# Altium schematic symbol library jlcpcb_2025_04_capacitors_extended_0402.schlib: 3594 symbols (part 10 of 20)
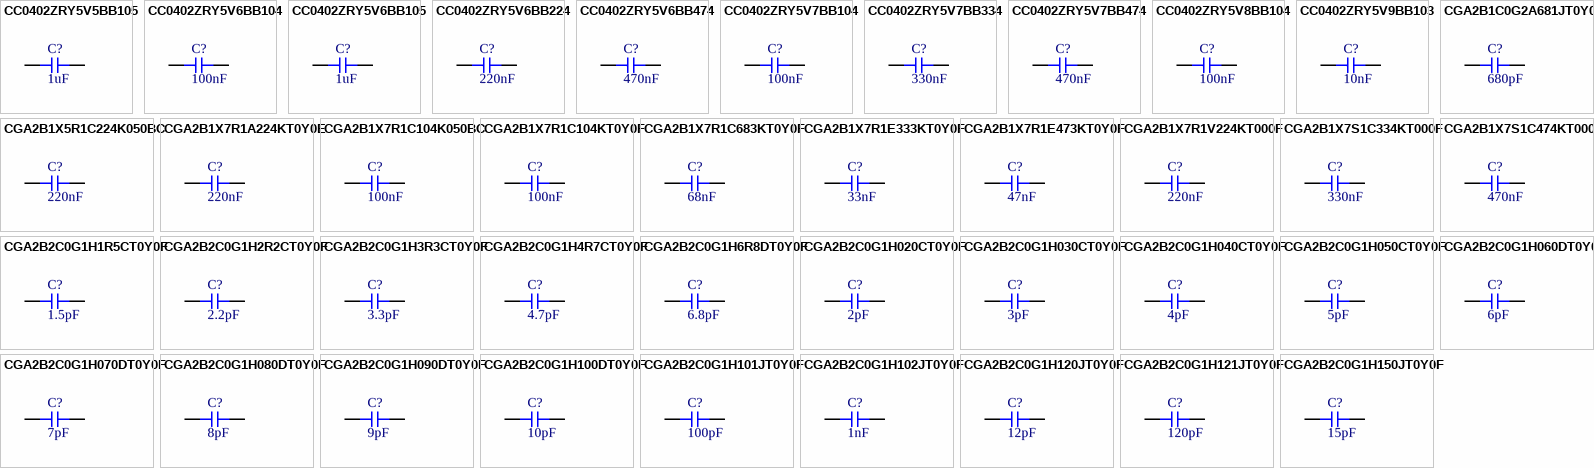
[diagram p98: symbols CC0402ZRY5V5BB105 to CGA2B2C0G1H150JT0Y0F]

## CC0402ZRY5V5BB105
designator C?  Capacitance: 1uF  (hidden comment: *)
Capacitor, Ceramic (MLCC), 1uF, 6.3V, Y5V, SMD 0402; Manufacturer: YAGEO; Manufacturer Part Number: CC0402ZRY5V5BB105; Temperature Rating: -20%~+80%; Package Size: 0402; JLCPCB Basic Part: No; JLCPCB Part Number: C527032; Supplier 1: LCSC; Category: Capacitors - MLCC; Supplier Part Number 1: C527032; Voltage Rating: 6.3V; Temperature Coefficient: Y5V; RoHS: Yes; ComponentLink1Description: Datasheet; ComponentLink1URL: https://wmsc.lcsc.com/wmsc/upload/file/pdf/v2/lcsc/2006031835_YAGEO-CC0402ZRY5V5BB105_C527032.pdf; ComponentLink2Description: JLCPCB Part URL; ComponentLink2URL: https://jlcpcb.com/partdetail/C527032; ComponentLink3Description: LCSC Part URL; ComponentLink3URL: https://lcsc.com/product-detail/Multilayer-Ceramic-Capacitors-MLCC---SMD-SMT_YAGEO-YAGEO-CC0402ZRY5V5BB105_C527032.html
footprint CAP-0402 (0402 (1005M) Capacitor)
pins: 1, 2

## CC0402ZRY5V6BB104
designator C?  Capacitance: 100nF  (hidden comment: *)
Capacitor, Ceramic (MLCC), 100nF, 10V, Y5V, SMD 0402; Manufacturer: YAGEO; Manufacturer Part Number: CC0402ZRY5V6BB104; Temperature Rating: -20%~+80%; Package Size: 0402; JLCPCB Basic Part: No; JLCPCB Part Number: C541407; Supplier 1: LCSC; Category: Capacitors - MLCC; Supplier Part Number 1: C541407; Voltage Rating: 10V; Temperature Coefficient: Y5V; RoHS: Yes; ComponentLink1Description: Datasheet; ComponentLink1URL: https://wmsc.lcsc.com/wmsc/upload/file/pdf/v2/lcsc/2006151134_YAGEO-CC0402ZRY5V6BB104_C541407.pdf; ComponentLink2Description: JLCPCB Part URL; ComponentLink2URL: https://jlcpcb.com/partdetail/C541407; ComponentLink3Description: LCSC Part URL; ComponentLink3URL: https://lcsc.com/product-detail/Multilayer-Ceramic-Capacitors-MLCC---SMD-SMT_YAGEO-YAGEO-CC0402ZRY5V6BB104_C541407.html
footprint CAP-0402 (0402 (1005M) Capacitor)
pins: 1, 2

## CC0402ZRY5V6BB105
designator C?  Capacitance: 1uF  (hidden comment: *)
Capacitor, Ceramic (MLCC), 1uF, 10V, Y5V, SMD 0402; Manufacturer: YAGEO; Manufacturer Part Number: CC0402ZRY5V6BB105; Temperature Rating: -20%~+80%; Package Size: 0402; JLCPCB Basic Part: No; JLCPCB Part Number: C354265; Supplier 1: LCSC; Category: Capacitors - MLCC; Supplier Part Number 1: C354265; Voltage Rating: 10V; Temperature Coefficient: Y5V; RoHS: Yes; ComponentLink1Description: Datasheet; ComponentLink1URL: https://wmsc.lcsc.com/wmsc/upload/file/pdf/v2/lcsc/1912111437_YAGEO-CC0402ZRY5V6BB105_C354265.pdf; ComponentLink2Description: JLCPCB Part URL; ComponentLink2URL: https://jlcpcb.com/partdetail/C354265; ComponentLink3Description: LCSC Part URL; ComponentLink3URL: https://lcsc.com/product-detail/Multilayer-Ceramic-Capacitors-MLCC---SMD-SMT_YAGEO-YAGEO-CC0402ZRY5V6BB105_C354265.html
footprint CAP-0402 (0402 (1005M) Capacitor)
pins: 1, 2

## CC0402ZRY5V6BB224
designator C?  Capacitance: 220nF  (hidden comment: *)
Capacitor, Ceramic (MLCC), 220nF, 10V, Y5V, SMD 0402; Manufacturer: YAGEO; Manufacturer Part Number: CC0402ZRY5V6BB224; Temperature Rating: -20%~+80%; Package Size: 0402; JLCPCB Basic Part: No; JLCPCB Part Number: C327202; Supplier 1: LCSC; Category: Capacitors - MLCC; Supplier Part Number 1: C327202; Voltage Rating: 10V; Temperature Coefficient: Y5V; RoHS: Yes; ComponentLink1Description: Datasheet; ComponentLink1URL: https://wmsc.lcsc.com/wmsc/upload/file/pdf/v2/lcsc/2311211121_YAGEO-CC0402ZRY5V6BB224_C327202.pdf; ComponentLink2Description: JLCPCB Part URL; ComponentLink2URL: https://jlcpcb.com/partdetail/C327202; ComponentLink3Description: LCSC Part URL; ComponentLink3URL: https://lcsc.com/product-detail/Multilayer-Ceramic-Capacitors-MLCC---SMD-SMT_YAGEO-YAGEO-CC0402ZRY5V6BB224_C327202.html
footprint CAP-0402 (0402 (1005M) Capacitor)
pins: 1, 2

## CC0402ZRY5V6BB474
designator C?  Capacitance: 470nF  (hidden comment: *)
Capacitor, Ceramic (MLCC), 470nF, 10V, Y5V, SMD 0402; Manufacturer: YAGEO; Manufacturer Part Number: CC0402ZRY5V6BB474; Temperature Rating: -20%~+80%; Package Size: 0402; JLCPCB Basic Part: No; JLCPCB Part Number: C327098; Supplier 1: LCSC; Category: Capacitors - MLCC; Supplier Part Number 1: C327098; Voltage Rating: 10V; Temperature Coefficient: Y5V; RoHS: Yes; ComponentLink1Description: Datasheet; ComponentLink1URL: https://wmsc.lcsc.com/wmsc/upload/file/pdf/v2/lcsc/1811141233_YAGEO-CC0402ZRY5V6BB474_C327098.pdf; ComponentLink2Description: JLCPCB Part URL; ComponentLink2URL: https://jlcpcb.com/partdetail/C327098; ComponentLink3Description: LCSC Part URL; ComponentLink3URL: https://lcsc.com/product-detail/Multilayer-Ceramic-Capacitors-MLCC---SMD-SMT_YAGEO-YAGEO-CC0402ZRY5V6BB474_C327098.html
footprint CAP-0402 (0402 (1005M) Capacitor)
pins: 1, 2

## CC0402ZRY5V7BB104
designator C?  Capacitance: 100nF  (hidden comment: *)
Capacitor, Ceramic (MLCC), 100nF, 16V, Y5V, SMD 0402; Manufacturer: YAGEO; Manufacturer Part Number: CC0402ZRY5V7BB104; Temperature Rating: -20%~+80%; Package Size: 0402; JLCPCB Basic Part: No; JLCPCB Part Number: C106209; Supplier 1: LCSC; Category: Capacitors - MLCC; Supplier Part Number 1: C106209; Voltage Rating: 16V; Temperature Coefficient: Y5V; RoHS: Yes; ComponentLink1Description: Datasheet; ComponentLink1URL: https://wmsc.lcsc.com/wmsc/upload/file/pdf/v2/lcsc/2304140030_YAGEO-CC0402ZRY5V7BB104_C106209.pdf; ComponentLink2Description: JLCPCB Part URL; ComponentLink2URL: https://jlcpcb.com/partdetail/C106209; ComponentLink3Description: LCSC Part URL; ComponentLink3URL: https://lcsc.com/product-detail/Multilayer-Ceramic-Capacitors-MLCC---SMD-SMT_YAGEO-YAGEO-CC0402ZRY5V7BB104_C106209.html
footprint CAP-0402 (0402 (1005M) Capacitor)
pins: 1, 2

## CC0402ZRY5V7BB334
designator C?  Capacitance: 330nF  (hidden comment: *)
Capacitor, Ceramic (MLCC), 330nF, 16V, Y5V, SMD 0402; Manufacturer: YAGEO; Manufacturer Part Number: CC0402ZRY5V7BB334; Temperature Rating: -20%~+80%; Package Size: 0402; JLCPCB Basic Part: No; JLCPCB Part Number: C527033; Supplier 1: LCSC; Category: Capacitors - MLCC; Supplier Part Number 1: C527033; Voltage Rating: 16V; Temperature Coefficient: Y5V; RoHS: Yes; ComponentLink1Description: Datasheet; ComponentLink1URL: https://wmsc.lcsc.com/wmsc/upload/file/pdf/v2/lcsc/2010151207_YAGEO-CC0402ZRY5V7BB334_C527033.pdf; ComponentLink2Description: JLCPCB Part URL; ComponentLink2URL: https://jlcpcb.com/partdetail/C527033; ComponentLink3Description: LCSC Part URL; ComponentLink3URL: https://lcsc.com/product-detail/Multilayer-Ceramic-Capacitors-MLCC---SMD-SMT_YAGEO-YAGEO-CC0402ZRY5V7BB334_C527033.html
footprint CAP-0402 (0402 (1005M) Capacitor)
pins: 1, 2

## CC0402ZRY5V7BB474
designator C?  Capacitance: 470nF  (hidden comment: *)
Capacitor, Ceramic (MLCC), 470nF, 16V, Y5V, SMD 0402; Manufacturer: YAGEO; Manufacturer Part Number: CC0402ZRY5V7BB474; Temperature Rating: -20%~+80%; Package Size: 0402; JLCPCB Basic Part: No; JLCPCB Part Number: C576752; Supplier 1: LCSC; Category: Capacitors - MLCC; Supplier Part Number 1: C576752; Voltage Rating: 16V; Temperature Coefficient: Y5V; RoHS: Yes; ComponentLink1Description: Datasheet; ComponentLink1URL: https://wmsc.lcsc.com/wmsc/upload/file/pdf/v2/lcsc/2006091814_YAGEO-CC0402ZRY5V7BB474_C576752.pdf; ComponentLink2Description: JLCPCB Part URL; ComponentLink2URL: https://jlcpcb.com/partdetail/C576752; ComponentLink3Description: LCSC Part URL; ComponentLink3URL: https://lcsc.com/product-detail/Multilayer-Ceramic-Capacitors-MLCC---SMD-SMT_YAGEO-YAGEO-CC0402ZRY5V7BB474_C576752.html
footprint CAP-0402 (0402 (1005M) Capacitor)
pins: 1, 2

## CC0402ZRY5V8BB104
designator C?  Capacitance: 100nF  (hidden comment: *)
Capacitor, Ceramic (MLCC), 100nF, 25V, Y5V, SMD 0402; Manufacturer: YAGEO; Manufacturer Part Number: CC0402ZRY5V8BB104; Temperature Rating: -20%~+80%; Package Size: 0402; JLCPCB Basic Part: No; JLCPCB Part Number: C106252; Supplier 1: LCSC; Category: Capacitors - MLCC; Supplier Part Number 1: C106252; Voltage Rating: 25V; Temperature Coefficient: Y5V; RoHS: Yes; ComponentLink1Description: Datasheet; ComponentLink1URL: https://wmsc.lcsc.com/wmsc/upload/file/pdf/v2/lcsc/2304140030_YAGEO-CC0402ZRY5V8BB104_C106252.pdf; ComponentLink2Description: JLCPCB Part URL; ComponentLink2URL: https://jlcpcb.com/partdetail/C106252; ComponentLink3Description: LCSC Part URL; ComponentLink3URL: https://lcsc.com/product-detail/Multilayer-Ceramic-Capacitors-MLCC---SMD-SMT_YAGEO-YAGEO-CC0402ZRY5V8BB104_C106252.html
footprint CAP-0402 (0402 (1005M) Capacitor)
pins: 1, 2

## CC0402ZRY5V9BB103
designator C?  Capacitance: 10nF  (hidden comment: *)
Capacitor, Ceramic (MLCC), 10nF, 50V, Y5V, SMD 0402; Manufacturer: YAGEO; Manufacturer Part Number: CC0402ZRY5V9BB103; Temperature Rating: -20%~+80%; Package Size: 0402; JLCPCB Basic Part: No; JLCPCB Part Number: C576758; Supplier 1: LCSC; Category: Capacitors - MLCC; Supplier Part Number 1: C576758; Voltage Rating: 50V; Temperature Coefficient: Y5V; RoHS: Yes; ComponentLink1Description: Datasheet; ComponentLink1URL: https://wmsc.lcsc.com/wmsc/upload/file/pdf/v2/lcsc/2208091530_YAGEO-CC0402ZRY5V9BB103_C576758.pdf; ComponentLink2Description: JLCPCB Part URL; ComponentLink2URL: https://jlcpcb.com/partdetail/C576758; ComponentLink3Description: LCSC Part URL; ComponentLink3URL: https://lcsc.com/product-detail/Multilayer-Ceramic-Capacitors-MLCC---SMD-SMT_YAGEO-YAGEO-CC0402ZRY5V9BB103_C576758.html
footprint CAP-0402 (0402 (1005M) Capacitor)
pins: 1, 2

## CGA2B1C0G2A681JT0Y0S
designator C?  Capacitance: 680pF  (hidden comment: *)
Capacitor, Ceramic (MLCC), 680pF, ±5%, 100V, C0G, ±5%, SMD 0402; Manufacturer: TDK; Manufacturer Part Number: CGA2B1C0G2A681JT0Y0S; Package Size: 0402; JLCPCB Basic Part: No; JLCPCB Part Number: C880689; Supplier 1: LCSC; Category: Capacitors - MLCC; Supplier Part Number 1: C880689; Tolerance: ±5%; Voltage Rating: 100V; Temperature Coefficient: C0G; RoHS: Yes; ComponentLink1Description: Datasheet; ComponentLink1URL: https://wmsc.lcsc.com/wmsc/upload/file/pdf/v2/lcsc/2304140030_TDK-CGA2B1C0G2A681JT0Y0S_C880689.pdf; ComponentLink2Description: JLCPCB Part URL; ComponentLink2URL: https://jlcpcb.com/partdetail/C880689; ComponentLink3Description: LCSC Part URL; ComponentLink3URL: https://lcsc.com/product-detail/Multilayer-Ceramic-Capacitors-MLCC---SMD-SMT_TDK-TDK-CGA2B1C0G2A681JT0Y0S_C880689.html
footprint CAP-0402 (0402 (1005M) Capacitor)
pins: 1, 2

## CGA2B1X5R1C224K050BC
designator C?  Capacitance: 220nF  (hidden comment: *)
Capacitor, Ceramic (MLCC), 220nF, ±10%, 16V, X5R, ±10%, SMD 0402; Manufacturer: TDK; Manufacturer Part Number: CGA2B1X5R1C224K050BC; Package Size: 0402; JLCPCB Basic Part: No; JLCPCB Part Number: C193115; Supplier 1: LCSC; Category: Capacitors - MLCC; Supplier Part Number 1: C193115; Tolerance: ±10%; Voltage Rating: 16V; Temperature Coefficient: X5R; RoHS: Yes; ComponentLink1Description: Datasheet; ComponentLink1URL: https://wmsc.lcsc.com/wmsc/upload/file/pdf/v2/lcsc/2304140030_TDK-CGA2B1X5R1C224K050BC_C193115.pdf; ComponentLink2Description: JLCPCB Part URL; ComponentLink2URL: https://jlcpcb.com/partdetail/C193115; ComponentLink3Description: LCSC Part URL; ComponentLink3URL: https://lcsc.com/product-detail/Multilayer-Ceramic-Capacitors-MLCC---SMD-SMT_TDK-TDK-CGA2B1X5R1C224K050BC_C193115.html
footprint CAP-0402 (0402 (1005M) Capacitor)
pins: 1, 2

## CGA2B1X7R1A224KT0Y0E
designator C?  Capacitance: 220nF  (hidden comment: *)
Capacitor, Ceramic (MLCC), 220nF, ±10%, 10V, X7R, ±10%, SMD 0402; Manufacturer: TDK; Manufacturer Part Number: CGA2B1X7R1A224KT0Y0E; Package Size: 0402; JLCPCB Basic Part: No; JLCPCB Part Number: C343048; Supplier 1: LCSC; Category: Capacitors - MLCC; Supplier Part Number 1: C343048; Tolerance: ±10%; Voltage Rating: 10V; Temperature Coefficient: X7R; RoHS: Yes; ComponentLink1Description: Datasheet; ComponentLink1URL: https://wmsc.lcsc.com/wmsc/upload/file/pdf/v2/lcsc/2304140030_TDK-CGA2B1X7R1A224KT0Y0E_C343048.pdf; ComponentLink2Description: JLCPCB Part URL; ComponentLink2URL: https://jlcpcb.com/partdetail/C343048; ComponentLink3Description: LCSC Part URL; ComponentLink3URL: https://lcsc.com/product-detail/Multilayer-Ceramic-Capacitors-MLCC---SMD-SMT_TDK-TDK-CGA2B1X7R1A224KT0Y0E_C343048.html
footprint CAP-0402 (0402 (1005M) Capacitor)
pins: 1, 2

## CGA2B1X7R1C104K050BC
designator C?  Capacitance: 100nF  (hidden comment: *)
Capacitor, Ceramic (MLCC), 100nF, ±10%, 16V, X7R, ±10%, SMD 0402; Manufacturer: TDK; Manufacturer Part Number: CGA2B1X7R1C104K050BC; Package Size: 0402; JLCPCB Basic Part: No; JLCPCB Part Number: C194982; Supplier 1: LCSC; Category: Capacitors - MLCC; Supplier Part Number 1: C194982; Tolerance: ±10%; Voltage Rating: 16V; Temperature Coefficient: X7R; RoHS: Yes; ComponentLink1Description: Datasheet; ComponentLink1URL: https://wmsc.lcsc.com/wmsc/upload/file/pdf/v2/lcsc/2304140030_TDK-CGA2B1X7R1C104K050BC_C194982.pdf; ComponentLink2Description: JLCPCB Part URL; ComponentLink2URL: https://jlcpcb.com/partdetail/C194982; ComponentLink3Description: LCSC Part URL; ComponentLink3URL: https://lcsc.com/product-detail/Multilayer-Ceramic-Capacitors-MLCC---SMD-SMT_TDK-TDK-CGA2B1X7R1C104K050BC_C194982.html
footprint CAP-0402 (0402 (1005M) Capacitor)
pins: 1, 2

## CGA2B1X7R1C104KT0Y0F
designator C?  Capacitance: 100nF  (hidden comment: *)
Capacitor, Ceramic (MLCC), 100nF, ±10%, 16V, X7R, ±10%, SMD 0402; Manufacturer: TDK; Manufacturer Part Number: CGA2B1X7R1C104KT0Y0F; Package Size: 0402; JLCPCB Basic Part: No; JLCPCB Part Number: C76698; Supplier 1: LCSC; Category: Capacitors - MLCC; Supplier Part Number 1: C76698; Tolerance: ±10%; Voltage Rating: 16V; Temperature Coefficient: X7R; RoHS: Yes; ComponentLink1Description: Datasheet; ComponentLink1URL: https://wmsc.lcsc.com/wmsc/upload/file/pdf/v2/lcsc/2304140030_TDK-CGA2B1X7R1C104KT0Y0F_C76698.pdf; ComponentLink2Description: JLCPCB Part URL; ComponentLink2URL: https://jlcpcb.com/partdetail/C76698; ComponentLink3Description: LCSC Part URL; ComponentLink3URL: https://lcsc.com/product-detail/Multilayer-Ceramic-Capacitors-MLCC---SMD-SMT_TDK-TDK-CGA2B1X7R1C104KT0Y0F_C76698.html
footprint CAP-0402 (0402 (1005M) Capacitor)
pins: 1, 2

## CGA2B1X7R1C683KT0Y0F
designator C?  Capacitance: 68nF  (hidden comment: *)
Capacitor, Ceramic (MLCC), 68nF, ±10%, 16V, X7R, ±10%, SMD 0402; Manufacturer: TDK; Manufacturer Part Number: CGA2B1X7R1C683KT0Y0F; Package Size: 0402; JLCPCB Basic Part: No; JLCPCB Part Number: C343054; Supplier 1: LCSC; Category: Capacitors - MLCC; Supplier Part Number 1: C343054; Tolerance: ±10%; Voltage Rating: 16V; Temperature Coefficient: X7R; RoHS: Yes; ComponentLink1Description: Datasheet; ComponentLink1URL: https://wmsc.lcsc.com/wmsc/upload/file/pdf/v2/lcsc/2304140030_TDK-CGA2B1X7R1C683KT0Y0F_C343054.pdf; ComponentLink2Description: JLCPCB Part URL; ComponentLink2URL: https://jlcpcb.com/partdetail/C343054; ComponentLink3Description: LCSC Part URL; ComponentLink3URL: https://lcsc.com/product-detail/Multilayer-Ceramic-Capacitors-MLCC---SMD-SMT_TDK-TDK-CGA2B1X7R1C683KT0Y0F_C343054.html
footprint CAP-0402 (0402 (1005M) Capacitor)
pins: 1, 2

## CGA2B1X7R1E333KT0Y0F
designator C?  Capacitance: 33nF  (hidden comment: *)
Capacitor, Ceramic (MLCC), 33nF, ±10%, 25V, X7R, ±10%, SMD 0402; Manufacturer: TDK; Manufacturer Part Number: CGA2B1X7R1E333KT0Y0F; Package Size: 0402; JLCPCB Basic Part: No; JLCPCB Part Number: C343053; Supplier 1: LCSC; Category: Capacitors - MLCC; Supplier Part Number 1: C343053; Tolerance: ±10%; Voltage Rating: 25V; Temperature Coefficient: X7R; RoHS: Yes; ComponentLink1Description: Datasheet; ComponentLink1URL: https://wmsc.lcsc.com/wmsc/upload/file/pdf/v2/lcsc/2109091030_TDK-CGA2B1X7R1E333KT0Y0F_C343053.pdf; ComponentLink2Description: JLCPCB Part URL; ComponentLink2URL: https://jlcpcb.com/partdetail/C343053; ComponentLink3Description: LCSC Part URL; ComponentLink3URL: https://lcsc.com/product-detail/Multilayer-Ceramic-Capacitors-MLCC---SMD-SMT_TDK-TDK-CGA2B1X7R1E333KT0Y0F_C343053.html
footprint CAP-0402 (0402 (1005M) Capacitor)
pins: 1, 2

## CGA2B1X7R1E473KT0Y0F
designator C?  Capacitance: 47nF  (hidden comment: *)
Capacitor, Ceramic (MLCC), 47nF, ±10%, 25V, X7R, ±10%, SMD 0402; Manufacturer: TDK; Manufacturer Part Number: CGA2B1X7R1E473KT0Y0F; Package Size: 0402; JLCPCB Basic Part: No; JLCPCB Part Number: C343056; Supplier 1: LCSC; Category: Capacitors - MLCC; Supplier Part Number 1: C343056; Tolerance: ±10%; Voltage Rating: 25V; Temperature Coefficient: X7R; RoHS: Yes; ComponentLink1Description: Datasheet; ComponentLink1URL: https://wmsc.lcsc.com/wmsc/upload/file/pdf/v2/lcsc/2304140030_TDK-CGA2B1X7R1E473KT0Y0F_C343056.pdf; ComponentLink2Description: JLCPCB Part URL; ComponentLink2URL: https://jlcpcb.com/partdetail/C343056; ComponentLink3Description: LCSC Part URL; ComponentLink3URL: https://lcsc.com/product-detail/Multilayer-Ceramic-Capacitors-MLCC---SMD-SMT_TDK-TDK-CGA2B1X7R1E473KT0Y0F_C343056.html
footprint CAP-0402 (0402 (1005M) Capacitor)
pins: 1, 2

## CGA2B1X7R1V224KT000F
designator C?  Capacitance: 220nF  (hidden comment: *)
Capacitor, Ceramic (MLCC), 220nF, ±10%, 35V, X7R, ±10%, SMD 0402; Manufacturer: TDK; Manufacturer Part Number: CGA2B1X7R1V224KT000F; Package Size: 0402; JLCPCB Basic Part: No; JLCPCB Part Number: C694490; Supplier 1: LCSC; Category: Capacitors - MLCC; Supplier Part Number 1: C694490; Tolerance: ±10%; Voltage Rating: 35V; Temperature Coefficient: X7R; RoHS: Yes; ComponentLink1Description: Datasheet; ComponentLink1URL: https://wmsc.lcsc.com/wmsc/upload/file/pdf/v2/lcsc/2304140030_TDK-CGA2B1X7R1V224KT000F_C694490.pdf; ComponentLink2Description: JLCPCB Part URL; ComponentLink2URL: https://jlcpcb.com/partdetail/C694490; ComponentLink3Description: LCSC Part URL; ComponentLink3URL: https://lcsc.com/product-detail/Multilayer-Ceramic-Capacitors-MLCC---SMD-SMT_TDK-TDK-CGA2B1X7R1V224KT000F_C694490.html
footprint CAP-0402 (0402 (1005M) Capacitor)
pins: 1, 2

## CGA2B1X7S1C334KT000F
designator C?  Capacitance: 330nF  (hidden comment: *)
Capacitor, Ceramic (MLCC), 330nF, ±10%, 16V, X7S, ±10%, SMD 0402; Manufacturer: TDK; Manufacturer Part Number: CGA2B1X7S1C334KT000F; Package Size: 0402; JLCPCB Basic Part: No; JLCPCB Part Number: C432935; Supplier 1: LCSC; Category: Capacitors - MLCC; Supplier Part Number 1: C432935; Tolerance: ±10%; Voltage Rating: 16V; Temperature Coefficient: X7S; RoHS: Yes; ComponentLink1Description: Datasheet; ComponentLink1URL: https://wmsc.lcsc.com/wmsc/upload/file/pdf/v2/lcsc/2304140030_TDK-CGA2B1X7S1C334KT000F_C432935.pdf; ComponentLink2Description: JLCPCB Part URL; ComponentLink2URL: https://jlcpcb.com/partdetail/C432935; ComponentLink3Description: LCSC Part URL; ComponentLink3URL: https://lcsc.com/product-detail/Multilayer-Ceramic-Capacitors-MLCC---SMD-SMT_TDK-TDK-CGA2B1X7S1C334KT000F_C432935.html
footprint CAP-0402 (0402 (1005M) Capacitor)
pins: 1, 2

## CGA2B1X7S1C474KT000F
designator C?  Capacitance: 470nF  (hidden comment: *)
Capacitor, Ceramic (MLCC), 470nF, ±10%, 16V, X7S, ±10%, SMD 0402; Manufacturer: TDK; Manufacturer Part Number: CGA2B1X7S1C474KT000F; Package Size: 0402; JLCPCB Basic Part: No; JLCPCB Part Number: C432936; Supplier 1: LCSC; Category: Capacitors - MLCC; Supplier Part Number 1: C432936; Tolerance: ±10%; Voltage Rating: 16V; Temperature Coefficient: X7S; RoHS: Yes; ComponentLink1Description: Datasheet; ComponentLink1URL: https://wmsc.lcsc.com/wmsc/upload/file/pdf/v2/lcsc/2304140030_TDK-CGA2B1X7S1C474KT000F_C432936.pdf; ComponentLink2Description: JLCPCB Part URL; ComponentLink2URL: https://jlcpcb.com/partdetail/C432936; ComponentLink3Description: LCSC Part URL; ComponentLink3URL: https://lcsc.com/product-detail/Multilayer-Ceramic-Capacitors-MLCC---SMD-SMT_TDK-TDK-CGA2B1X7S1C474KT000F_C432936.html
footprint CAP-0402 (0402 (1005M) Capacitor)
pins: 1, 2

## CGA2B2C0G1H1R5CT0Y0F
designator C?  Capacitance: 1.5pF  (hidden comment: *)
Capacitor, Ceramic (MLCC), 1.5pF, 50V, C0G, SMD 0402; Manufacturer: TDK; Manufacturer Part Number: CGA2B2C0G1H1R5CT0Y0F; Package Size: 0402; JLCPCB Basic Part: No; JLCPCB Part Number: C342942; Supplier 1: LCSC; Category: Capacitors - MLCC; Supplier Part Number 1: C342942; Voltage Rating: 50V; Temperature Coefficient: C0G; RoHS: Yes; ComponentLink1Description: Datasheet; ComponentLink1URL: https://wmsc.lcsc.com/wmsc/upload/file/pdf/v2/lcsc/2304140030_TDK-CGA2B2C0G1H1R5CT0Y0F_C342942.pdf; ComponentLink2Description: JLCPCB Part URL; ComponentLink2URL: https://jlcpcb.com/partdetail/C342942; ComponentLink3Description: LCSC Part URL; ComponentLink3URL: https://lcsc.com/product-detail/Multilayer-Ceramic-Capacitors-MLCC---SMD-SMT_TDK-TDK-CGA2B2C0G1H1R5CT0Y0F_C342942.html
footprint CAP-0402 (0402 (1005M) Capacitor)
pins: 1, 2

## CGA2B2C0G1H2R2CT0Y0F
designator C?  Capacitance: 2.2pF  (hidden comment: *)
Capacitor, Ceramic (MLCC), 2.2pF, 50V, C0G, SMD 0402; Manufacturer: TDK; Manufacturer Part Number: CGA2B2C0G1H2R2CT0Y0F; Package Size: 0402; JLCPCB Basic Part: No; JLCPCB Part Number: C694491; Supplier 1: LCSC; Category: Capacitors - MLCC; Supplier Part Number 1: C694491; Voltage Rating: 50V; Temperature Coefficient: C0G; RoHS: Yes; ComponentLink1Description: Datasheet; ComponentLink1URL: https://wmsc.lcsc.com/wmsc/upload/file/pdf/v2/lcsc/2304140030_TDK-CGA2B2C0G1H2R2CT0Y0F_C694491.pdf; ComponentLink2Description: JLCPCB Part URL; ComponentLink2URL: https://jlcpcb.com/partdetail/C694491; ComponentLink3Description: LCSC Part URL; ComponentLink3URL: https://lcsc.com/product-detail/Multilayer-Ceramic-Capacitors-MLCC---SMD-SMT_TDK-TDK-CGA2B2C0G1H2R2CT0Y0F_C694491.html
footprint CAP-0402 (0402 (1005M) Capacitor)
pins: 1, 2

## CGA2B2C0G1H3R3CT0Y0F
designator C?  Capacitance: 3.3pF  (hidden comment: *)
Capacitor, Ceramic (MLCC), 3.3pF, 50V, C0G, SMD 0402; Manufacturer: TDK; Manufacturer Part Number: CGA2B2C0G1H3R3CT0Y0F; Package Size: 0402; JLCPCB Basic Part: No; JLCPCB Part Number: C694211; Supplier 1: LCSC; Category: Capacitors - MLCC; Supplier Part Number 1: C694211; Voltage Rating: 50V; Temperature Coefficient: C0G; RoHS: Yes; ComponentLink1Description: Datasheet; ComponentLink1URL: https://wmsc.lcsc.com/wmsc/upload/file/pdf/v2/lcsc/2304140030_TDK-CGA2B2C0G1H3R3CT0Y0F_C694211.pdf; ComponentLink2Description: JLCPCB Part URL; ComponentLink2URL: https://jlcpcb.com/partdetail/C694211; ComponentLink3Description: LCSC Part URL; ComponentLink3URL: https://lcsc.com/product-detail/Multilayer-Ceramic-Capacitors-MLCC---SMD-SMT_TDK-TDK-CGA2B2C0G1H3R3CT0Y0F_C694211.html
footprint CAP-0402 (0402 (1005M) Capacitor)
pins: 1, 2

## CGA2B2C0G1H4R7CT0Y0F
designator C?  Capacitance: 4.7pF  (hidden comment: *)
Capacitor, Ceramic (MLCC), 4.7pF, 50V, C0G, SMD 0402; Manufacturer: TDK; Manufacturer Part Number: CGA2B2C0G1H4R7CT0Y0F; Package Size: 0402; JLCPCB Basic Part: No; JLCPCB Part Number: C694212; Supplier 1: LCSC; Category: Capacitors - MLCC; Supplier Part Number 1: C694212; Voltage Rating: 50V; Temperature Coefficient: C0G; RoHS: Yes; ComponentLink1Description: Datasheet; ComponentLink1URL: https://wmsc.lcsc.com/wmsc/upload/file/pdf/v2/lcsc/2304140030_TDK-CGA2B2C0G1H4R7CT0Y0F_C694212.pdf; ComponentLink2Description: JLCPCB Part URL; ComponentLink2URL: https://jlcpcb.com/partdetail/C694212; ComponentLink3Description: LCSC Part URL; ComponentLink3URL: https://lcsc.com/product-detail/Multilayer-Ceramic-Capacitors-MLCC---SMD-SMT_TDK-TDK-CGA2B2C0G1H4R7CT0Y0F_C694212.html
footprint CAP-0402 (0402 (1005M) Capacitor)
pins: 1, 2

## CGA2B2C0G1H6R8DT0Y0F
designator C?  Capacitance: 6.8pF  (hidden comment: *)
Capacitor, Ceramic (MLCC), 6.8pF, 50V, C0G, SMD 0402; Manufacturer: TDK; Manufacturer Part Number: CGA2B2C0G1H6R8DT0Y0F; Package Size: 0402; JLCPCB Basic Part: No; JLCPCB Part Number: C338054; Supplier 1: LCSC; Category: Capacitors - MLCC; Supplier Part Number 1: C338054; Voltage Rating: 50V; Temperature Coefficient: C0G; RoHS: Yes; ComponentLink1Description: Datasheet; ComponentLink1URL: https://wmsc.lcsc.com/wmsc/upload/file/pdf/v2/lcsc/2304140030_TDK-CGA2B2C0G1H6R8DT0Y0F_C338054.pdf; ComponentLink2Description: JLCPCB Part URL; ComponentLink2URL: https://jlcpcb.com/partdetail/C338054; ComponentLink3Description: LCSC Part URL; ComponentLink3URL: https://lcsc.com/product-detail/Multilayer-Ceramic-Capacitors-MLCC---SMD-SMT_TDK-TDK-CGA2B2C0G1H6R8DT0Y0F_C338054.html
footprint CAP-0402 (0402 (1005M) Capacitor)
pins: 1, 2

## CGA2B2C0G1H020CT0Y0F
designator C?  Capacitance: 2pF  (hidden comment: *)
Capacitor, Ceramic (MLCC), 2pF, 50V, C0G, SMD 0402; Manufacturer: TDK; Manufacturer Part Number: CGA2B2C0G1H020CT0Y0F; Package Size: 0402; JLCPCB Basic Part: No; JLCPCB Part Number: C342935; Supplier 1: LCSC; Category: Capacitors - MLCC; Supplier Part Number 1: C342935; Voltage Rating: 50V; Temperature Coefficient: C0G; RoHS: Yes; ComponentLink1Description: Datasheet; ComponentLink1URL: https://wmsc.lcsc.com/wmsc/upload/file/pdf/v2/lcsc/2304140030_TDK-CGA2B2C0G1H020CT0Y0F_C342935.pdf; ComponentLink2Description: JLCPCB Part URL; ComponentLink2URL: https://jlcpcb.com/partdetail/C342935; ComponentLink3Description: LCSC Part URL; ComponentLink3URL: https://lcsc.com/product-detail/Multilayer-Ceramic-Capacitors-MLCC---SMD-SMT_TDK-TDK-CGA2B2C0G1H020CT0Y0F_C342935.html
footprint CAP-0402 (0402 (1005M) Capacitor)
pins: 1, 2

## CGA2B2C0G1H030CT0Y0F
designator C?  Capacitance: 3pF  (hidden comment: *)
Capacitor, Ceramic (MLCC), 3pF, 50V, C0G, SMD 0402; Manufacturer: TDK; Manufacturer Part Number: CGA2B2C0G1H030CT0Y0F; Package Size: 0402; JLCPCB Basic Part: No; JLCPCB Part Number: C342936; Supplier 1: LCSC; Category: Capacitors - MLCC; Supplier Part Number 1: C342936; Voltage Rating: 50V; Temperature Coefficient: C0G; RoHS: Yes; ComponentLink1Description: Datasheet; ComponentLink1URL: https://wmsc.lcsc.com/wmsc/upload/file/pdf/v2/lcsc/2304140030_TDK-CGA2B2C0G1H030CT0Y0F_C342936.pdf; ComponentLink2Description: JLCPCB Part URL; ComponentLink2URL: https://jlcpcb.com/partdetail/C342936; ComponentLink3Description: LCSC Part URL; ComponentLink3URL: https://lcsc.com/product-detail/Multilayer-Ceramic-Capacitors-MLCC---SMD-SMT_TDK-TDK-CGA2B2C0G1H030CT0Y0F_C342936.html
footprint CAP-0402 (0402 (1005M) Capacitor)
pins: 1, 2

## CGA2B2C0G1H040CT0Y0F
designator C?  Capacitance: 4pF  (hidden comment: *)
Capacitor, Ceramic (MLCC), 4pF, 50V, C0G, SMD 0402; Manufacturer: TDK; Manufacturer Part Number: CGA2B2C0G1H040CT0Y0F; Package Size: 0402; JLCPCB Basic Part: No; JLCPCB Part Number: C342937; Supplier 1: LCSC; Category: Capacitors - MLCC; Supplier Part Number 1: C342937; Voltage Rating: 50V; Temperature Coefficient: C0G; RoHS: Yes; ComponentLink1Description: Datasheet; ComponentLink1URL: https://wmsc.lcsc.com/wmsc/upload/file/pdf/v2/lcsc/2304140030_TDK-CGA2B2C0G1H040CT0Y0F_C342937.pdf; ComponentLink2Description: JLCPCB Part URL; ComponentLink2URL: https://jlcpcb.com/partdetail/C342937; ComponentLink3Description: LCSC Part URL; ComponentLink3URL: https://lcsc.com/product-detail/Multilayer-Ceramic-Capacitors-MLCC---SMD-SMT_TDK-TDK-CGA2B2C0G1H040CT0Y0F_C342937.html
footprint CAP-0402 (0402 (1005M) Capacitor)
pins: 1, 2

## CGA2B2C0G1H050CT0Y0F
designator C?  Capacitance: 5pF  (hidden comment: *)
Capacitor, Ceramic (MLCC), 5pF, 50V, C0G, SMD 0402; Manufacturer: TDK; Manufacturer Part Number: CGA2B2C0G1H050CT0Y0F; Package Size: 0402; JLCPCB Basic Part: No; JLCPCB Part Number: C342938; Supplier 1: LCSC; Category: Capacitors - MLCC; Supplier Part Number 1: C342938; Voltage Rating: 50V; Temperature Coefficient: C0G; RoHS: Yes; ComponentLink1Description: Datasheet; ComponentLink1URL: https://wmsc.lcsc.com/wmsc/upload/file/pdf/v2/lcsc/2304140030_TDK-CGA2B2C0G1H050CT0Y0F_C342938.pdf; ComponentLink2Description: JLCPCB Part URL; ComponentLink2URL: https://jlcpcb.com/partdetail/C342938; ComponentLink3Description: LCSC Part URL; ComponentLink3URL: https://lcsc.com/product-detail/Multilayer-Ceramic-Capacitors-MLCC---SMD-SMT_TDK-TDK-CGA2B2C0G1H050CT0Y0F_C342938.html
footprint CAP-0402 (0402 (1005M) Capacitor)
pins: 1, 2

## CGA2B2C0G1H060DT0Y0F
designator C?  Capacitance: 6pF  (hidden comment: *)
Capacitor, Ceramic (MLCC), 6pF, 50V, C0G, SMD 0402; Manufacturer: TDK; Manufacturer Part Number: CGA2B2C0G1H060DT0Y0F; Package Size: 0402; JLCPCB Basic Part: No; JLCPCB Part Number: C694209; Supplier 1: LCSC; Category: Capacitors - MLCC; Supplier Part Number 1: C694209; Voltage Rating: 50V; Temperature Coefficient: C0G; RoHS: Yes; ComponentLink1Description: Datasheet; ComponentLink1URL: https://wmsc.lcsc.com/wmsc/upload/file/pdf/v2/lcsc/2304140030_TDK-CGA2B2C0G1H060DT0Y0F_C694209.pdf; ComponentLink2Description: JLCPCB Part URL; ComponentLink2URL: https://jlcpcb.com/partdetail/C694209; ComponentLink3Description: LCSC Part URL; ComponentLink3URL: https://lcsc.com/product-detail/Multilayer-Ceramic-Capacitors-MLCC---SMD-SMT_TDK-TDK-CGA2B2C0G1H060DT0Y0F_C694209.html
footprint CAP-0402 (0402 (1005M) Capacitor)
pins: 1, 2

## CGA2B2C0G1H070DT0Y0F
designator C?  Capacitance: 7pF  (hidden comment: *)
Capacitor, Ceramic (MLCC), 7pF, 50V, C0G, SMD 0402; Manufacturer: TDK; Manufacturer Part Number: CGA2B2C0G1H070DT0Y0F; Package Size: 0402; JLCPCB Basic Part: No; JLCPCB Part Number: C694210; Supplier 1: LCSC; Category: Capacitors - MLCC; Supplier Part Number 1: C694210; Voltage Rating: 50V; Temperature Coefficient: C0G; RoHS: Yes; ComponentLink1Description: Datasheet; ComponentLink1URL: https://wmsc.lcsc.com/wmsc/upload/file/pdf/v2/lcsc/2304140030_TDK-CGA2B2C0G1H070DT0Y0F_C694210.pdf; ComponentLink2Description: JLCPCB Part URL; ComponentLink2URL: https://jlcpcb.com/partdetail/C694210; ComponentLink3Description: LCSC Part URL; ComponentLink3URL: https://lcsc.com/product-detail/Multilayer-Ceramic-Capacitors-MLCC---SMD-SMT_TDK-TDK-CGA2B2C0G1H070DT0Y0F_C694210.html
footprint CAP-0402 (0402 (1005M) Capacitor)
pins: 1, 2

## CGA2B2C0G1H080DT0Y0F
designator C?  Capacitance: 8pF  (hidden comment: *)
Capacitor, Ceramic (MLCC), 8pF, 50V, C0G, SMD 0402; Manufacturer: TDK; Manufacturer Part Number: CGA2B2C0G1H080DT0Y0F; Package Size: 0402; JLCPCB Basic Part: No; JLCPCB Part Number: C342939; Supplier 1: LCSC; Category: Capacitors - MLCC; Supplier Part Number 1: C342939; Voltage Rating: 50V; Temperature Coefficient: C0G; RoHS: Yes; ComponentLink1Description: Datasheet; ComponentLink1URL: https://wmsc.lcsc.com/wmsc/upload/file/pdf/v2/lcsc/2304140030_TDK-CGA2B2C0G1H080DT0Y0F_C342939.pdf; ComponentLink2Description: JLCPCB Part URL; ComponentLink2URL: https://jlcpcb.com/partdetail/C342939; ComponentLink3Description: LCSC Part URL; ComponentLink3URL: https://lcsc.com/product-detail/Multilayer-Ceramic-Capacitors-MLCC---SMD-SMT_TDK-TDK-CGA2B2C0G1H080DT0Y0F_C342939.html
footprint CAP-0402 (0402 (1005M) Capacitor)
pins: 1, 2

## CGA2B2C0G1H090DT0Y0F
designator C?  Capacitance: 9pF  (hidden comment: *)
Capacitor, Ceramic (MLCC), 9pF, 50V, C0G, SMD 0402; Manufacturer: TDK; Manufacturer Part Number: CGA2B2C0G1H090DT0Y0F; Package Size: 0402; JLCPCB Basic Part: No; JLCPCB Part Number: C342940; Supplier 1: LCSC; Category: Capacitors - MLCC; Supplier Part Number 1: C342940; Voltage Rating: 50V; Temperature Coefficient: C0G; RoHS: Yes; ComponentLink1Description: Datasheet; ComponentLink1URL: https://wmsc.lcsc.com/wmsc/upload/file/pdf/v2/lcsc/2304140030_TDK-CGA2B2C0G1H090DT0Y0F_C342940.pdf; ComponentLink2Description: JLCPCB Part URL; ComponentLink2URL: https://jlcpcb.com/partdetail/C342940; ComponentLink3Description: LCSC Part URL; ComponentLink3URL: https://lcsc.com/product-detail/Multilayer-Ceramic-Capacitors-MLCC---SMD-SMT_TDK-TDK-CGA2B2C0G1H090DT0Y0F_C342940.html
footprint CAP-0402 (0402 (1005M) Capacitor)
pins: 1, 2

## CGA2B2C0G1H100DT0Y0F
designator C?  Capacitance: 10pF  (hidden comment: *)
Capacitor, Ceramic (MLCC), 10pF, 50V, C0G, SMD 0402; Manufacturer: TDK; Manufacturer Part Number: CGA2B2C0G1H100DT0Y0F; Package Size: 0402; JLCPCB Basic Part: No; JLCPCB Part Number: C342941; Supplier 1: LCSC; Category: Capacitors - MLCC; Supplier Part Number 1: C342941; Voltage Rating: 50V; Temperature Coefficient: C0G; RoHS: Yes; ComponentLink1Description: Datasheet; ComponentLink1URL: https://wmsc.lcsc.com/wmsc/upload/file/pdf/v2/lcsc/1912111437_TDK-CGA2B2C0G1H100DT0Y0F_C342941.pdf; ComponentLink2Description: JLCPCB Part URL; ComponentLink2URL: https://jlcpcb.com/partdetail/C342941; ComponentLink3Description: LCSC Part URL; ComponentLink3URL: https://lcsc.com/product-detail/Multilayer-Ceramic-Capacitors-MLCC---SMD-SMT_TDK-TDK-CGA2B2C0G1H100DT0Y0F_C342941.html
footprint CAP-0402 (0402 (1005M) Capacitor)
pins: 1, 2

## CGA2B2C0G1H101JT0Y0F
designator C?  Capacitance: 100pF  (hidden comment: *)
Capacitor, Ceramic (MLCC), 100pF, ±5%, 50V, C0G, ±5%, SMD 0402; Manufacturer: TDK; Manufacturer Part Number: CGA2B2C0G1H101JT0Y0F; Package Size: 0402; JLCPCB Basic Part: No; JLCPCB Part Number: C76699; Supplier 1: LCSC; Category: Capacitors - MLCC; Supplier Part Number 1: C76699; Tolerance: ±5%; Voltage Rating: 50V; Temperature Coefficient: C0G; RoHS: Yes; ComponentLink1Description: Datasheet; ComponentLink1URL: https://wmsc.lcsc.com/wmsc/upload/file/pdf/v2/lcsc/2304140030_TDK-CGA2B2C0G1H101JT0Y0F_C76699.pdf; ComponentLink2Description: JLCPCB Part URL; ComponentLink2URL: https://jlcpcb.com/partdetail/C76699; ComponentLink3Description: LCSC Part URL; ComponentLink3URL: https://lcsc.com/product-detail/Multilayer-Ceramic-Capacitors-MLCC---SMD-SMT_TDK-TDK-CGA2B2C0G1H101JT0Y0F_C76699.html
footprint CAP-0402 (0402 (1005M) Capacitor)
pins: 1, 2

## CGA2B2C0G1H102JT0Y0F
designator C?  Capacitance: 1nF  (hidden comment: *)
Capacitor, Ceramic (MLCC), 1nF, ±5%, 50V, C0G, ±5%, SMD 0402; Manufacturer: TDK; Manufacturer Part Number: CGA2B2C0G1H102JT0Y0F; Package Size: 0402; JLCPCB Basic Part: No; JLCPCB Part Number: C338101; Supplier 1: LCSC; Category: Capacitors - MLCC; Supplier Part Number 1: C338101; Tolerance: ±5%; Voltage Rating: 50V; Temperature Coefficient: C0G; RoHS: Yes; ComponentLink1Description: Datasheet; ComponentLink1URL: https://wmsc.lcsc.com/wmsc/upload/file/pdf/v2/lcsc/2304140030_TDK-CGA2B2C0G1H102JT0Y0F_C338101.pdf; ComponentLink2Description: JLCPCB Part URL; ComponentLink2URL: https://jlcpcb.com/partdetail/C338101; ComponentLink3Description: LCSC Part URL; ComponentLink3URL: https://lcsc.com/product-detail/Multilayer-Ceramic-Capacitors-MLCC---SMD-SMT_TDK-TDK-CGA2B2C0G1H102JT0Y0F_C338101.html
footprint CAP-0402 (0402 (1005M) Capacitor)
pins: 1, 2

## CGA2B2C0G1H120JT0Y0F
designator C?  Capacitance: 12pF  (hidden comment: *)
Capacitor, Ceramic (MLCC), 12pF, ±5%, 50V, C0G, ±5%, SMD 0402; Manufacturer: TDK; Manufacturer Part Number: CGA2B2C0G1H120JT0Y0F; Package Size: 0402; JLCPCB Basic Part: No; JLCPCB Part Number: C76700; Supplier 1: LCSC; Category: Capacitors - MLCC; Supplier Part Number 1: C76700; Tolerance: ±5%; Voltage Rating: 50V; Temperature Coefficient: C0G; RoHS: Yes; ComponentLink1Description: Datasheet; ComponentLink1URL: https://wmsc.lcsc.com/wmsc/upload/file/pdf/v2/lcsc/2304140030_TDK-CGA2B2C0G1H120JT0Y0F_C76700.pdf; ComponentLink2Description: JLCPCB Part URL; ComponentLink2URL: https://jlcpcb.com/partdetail/C76700; ComponentLink3Description: LCSC Part URL; ComponentLink3URL: https://lcsc.com/product-detail/Multilayer-Ceramic-Capacitors-MLCC---SMD-SMT_TDK-TDK-CGA2B2C0G1H120JT0Y0F_C76700.html
footprint CAP-0402 (0402 (1005M) Capacitor)
pins: 1, 2

## CGA2B2C0G1H121JT0Y0F
designator C?  Capacitance: 120pF  (hidden comment: *)
Capacitor, Ceramic (MLCC), 120pF, ±5%, 50V, C0G, ±5%, SMD 0402; Manufacturer: TDK; Manufacturer Part Number: CGA2B2C0G1H121JT0Y0F; Package Size: 0402; JLCPCB Basic Part: No; JLCPCB Part Number: C695379; Supplier 1: LCSC; Category: Capacitors - MLCC; Supplier Part Number 1: C695379; Tolerance: ±5%; Voltage Rating: 50V; Temperature Coefficient: C0G; RoHS: Yes; ComponentLink1Description: Datasheet; ComponentLink1URL: https://wmsc.lcsc.com/wmsc/upload/file/pdf/v2/lcsc/2304140030_TDK-CGA2B2C0G1H121JT0Y0F_C695379.pdf; ComponentLink2Description: JLCPCB Part URL; ComponentLink2URL: https://jlcpcb.com/partdetail/C695379; ComponentLink3Description: LCSC Part URL; ComponentLink3URL: https://lcsc.com/product-detail/Multilayer-Ceramic-Capacitors-MLCC---SMD-SMT_TDK-TDK-CGA2B2C0G1H121JT0Y0F_C695379.html
footprint CAP-0402 (0402 (1005M) Capacitor)
pins: 1, 2

## CGA2B2C0G1H150JT0Y0F
designator C?  Capacitance: 15pF  (hidden comment: *)
Capacitor, Ceramic (MLCC), 15pF, ±5%, 50V, C0G, ±5%, SMD 0402; Manufacturer: TDK; Manufacturer Part Number: CGA2B2C0G1H150JT0Y0F; Package Size: 0402; JLCPCB Basic Part: No; JLCPCB Part Number: C338103; Supplier 1: LCSC; Category: Capacitors - MLCC; Supplier Part Number 1: C338103; Tolerance: ±5%; Voltage Rating: 50V; Temperature Coefficient: C0G; RoHS: Yes; ComponentLink1Description: Datasheet; ComponentLink1URL: https://wmsc.lcsc.com/wmsc/upload/file/pdf/v2/lcsc/2304140030_TDK-CGA2B2C0G1H150JT0Y0F_C338103.pdf; ComponentLink2Description: JLCPCB Part URL; ComponentLink2URL: https://jlcpcb.com/partdetail/C338103; ComponentLink3Description: LCSC Part URL; ComponentLink3URL: https://lcsc.com/product-detail/Multilayer-Ceramic-Capacitors-MLCC---SMD-SMT_TDK-TDK-CGA2B2C0G1H150JT0Y0F_C338103.html
footprint CAP-0402 (0402 (1005M) Capacitor)
pins: 1, 2

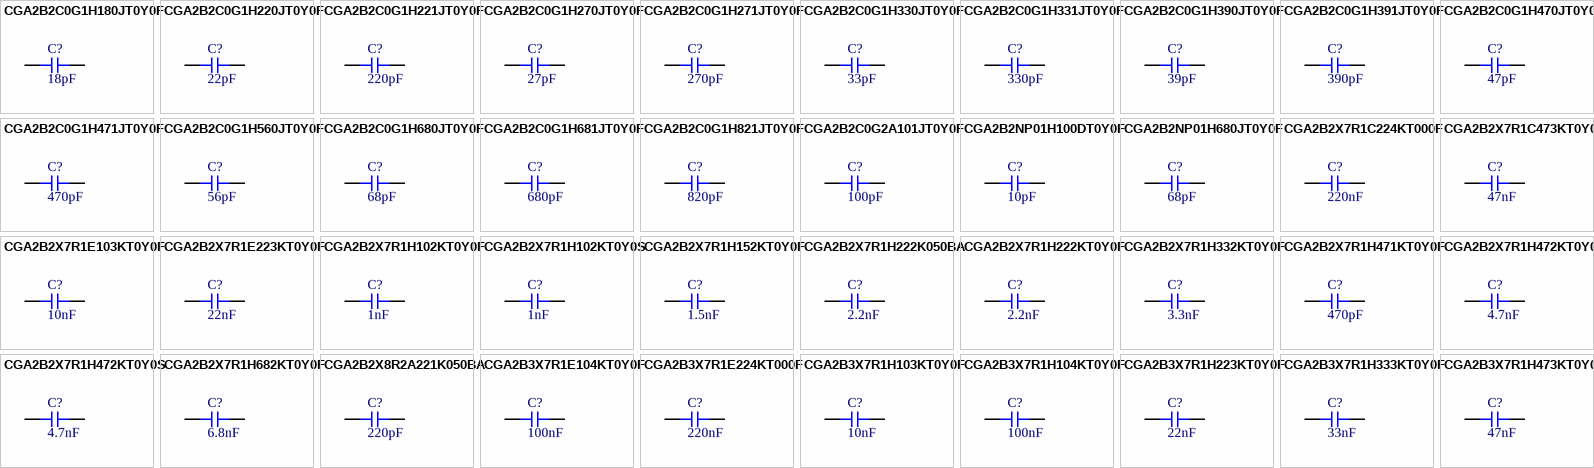
[diagram p43: symbols CGA2B2C0G1H180JT0Y0F to CGA2B3X7R1H473KT0Y0F]

## CGA2B2C0G1H180JT0Y0F
designator C?  Capacitance: 18pF  (hidden comment: *)
Capacitor, Ceramic (MLCC), 18pF, ±5%, 50V, C0G, ±5%, SMD 0402; Manufacturer: TDK; Manufacturer Part Number: CGA2B2C0G1H180JT0Y0F; Package Size: 0402; JLCPCB Basic Part: No; JLCPCB Part Number: C76701; Supplier 1: LCSC; Category: Capacitors - MLCC; Supplier Part Number 1: C76701; Tolerance: ±5%; Voltage Rating: 50V; Temperature Coefficient: C0G; RoHS: Yes; ComponentLink1Description: Datasheet; ComponentLink1URL: https://wmsc.lcsc.com/wmsc/upload/file/pdf/v2/lcsc/2304140030_TDK-CGA2B2C0G1H180JT0Y0F_C76701.pdf; ComponentLink2Description: JLCPCB Part URL; ComponentLink2URL: https://jlcpcb.com/partdetail/C76701; ComponentLink3Description: LCSC Part URL; ComponentLink3URL: https://lcsc.com/product-detail/Multilayer-Ceramic-Capacitors-MLCC---SMD-SMT_TDK-TDK-CGA2B2C0G1H180JT0Y0F_C76701.html
footprint CAP-0402 (0402 (1005M) Capacitor)
pins: 1, 2

## CGA2B2C0G1H220JT0Y0F
designator C?  Capacitance: 22pF  (hidden comment: *)
Capacitor, Ceramic (MLCC), 22pF, ±5%, 50V, C0G, ±5%, SMD 0402; Manufacturer: TDK; Manufacturer Part Number: CGA2B2C0G1H220JT0Y0F; Package Size: 0402; JLCPCB Basic Part: No; JLCPCB Part Number: C342943; Supplier 1: LCSC; Category: Capacitors - MLCC; Supplier Part Number 1: C342943; Tolerance: ±5%; Voltage Rating: 50V; Temperature Coefficient: C0G; RoHS: Yes; ComponentLink1Description: Datasheet; ComponentLink1URL: https://wmsc.lcsc.com/wmsc/upload/file/pdf/v2/lcsc/2304140030_TDK-CGA2B2C0G1H220JT0Y0F_C342943.pdf; ComponentLink2Description: JLCPCB Part URL; ComponentLink2URL: https://jlcpcb.com/partdetail/C342943; ComponentLink3Description: LCSC Part URL; ComponentLink3URL: https://lcsc.com/product-detail/Multilayer-Ceramic-Capacitors-MLCC---SMD-SMT_TDK-TDK-CGA2B2C0G1H220JT0Y0F_C342943.html
footprint CAP-0402 (0402 (1005M) Capacitor)
pins: 1, 2

## CGA2B2C0G1H221JT0Y0F
designator C?  Capacitance: 220pF  (hidden comment: *)
Capacitor, Ceramic (MLCC), 220pF, ±5%, 50V, C0G, ±5%, SMD 0402; Manufacturer: TDK; Manufacturer Part Number: CGA2B2C0G1H221JT0Y0F; Package Size: 0402; JLCPCB Basic Part: No; JLCPCB Part Number: C343058; Supplier 1: LCSC; Category: Capacitors - MLCC; Supplier Part Number 1: C343058; Tolerance: ±5%; Voltage Rating: 50V; Temperature Coefficient: C0G; RoHS: Yes; ComponentLink1Description: Datasheet; ComponentLink1URL: https://wmsc.lcsc.com/wmsc/upload/file/pdf/v2/lcsc/2205121145_TDK-CGA2B2C0G1H221JT0Y0F_C343058.pdf; ComponentLink2Description: JLCPCB Part URL; ComponentLink2URL: https://jlcpcb.com/partdetail/C343058; ComponentLink3Description: LCSC Part URL; ComponentLink3URL: https://lcsc.com/product-detail/Multilayer-Ceramic-Capacitors-MLCC---SMD-SMT_TDK-TDK-CGA2B2C0G1H221JT0Y0F_C343058.html
footprint CAP-0402 (0402 (1005M) Capacitor)
pins: 1, 2
